# Altium footprint library Mylib.PcbLib: 294 footprints (part 16 of 19)
Each footprint in its own frame and in the unit in brackets; x right, y up, seen from the top. Pads: shape width x height; smd on the part's side, far side on the other; paste and mask are expansions set on the pad; w line width, h text height; cw(c..) or ccw(c..) is an arc to the next point about the centre after c.
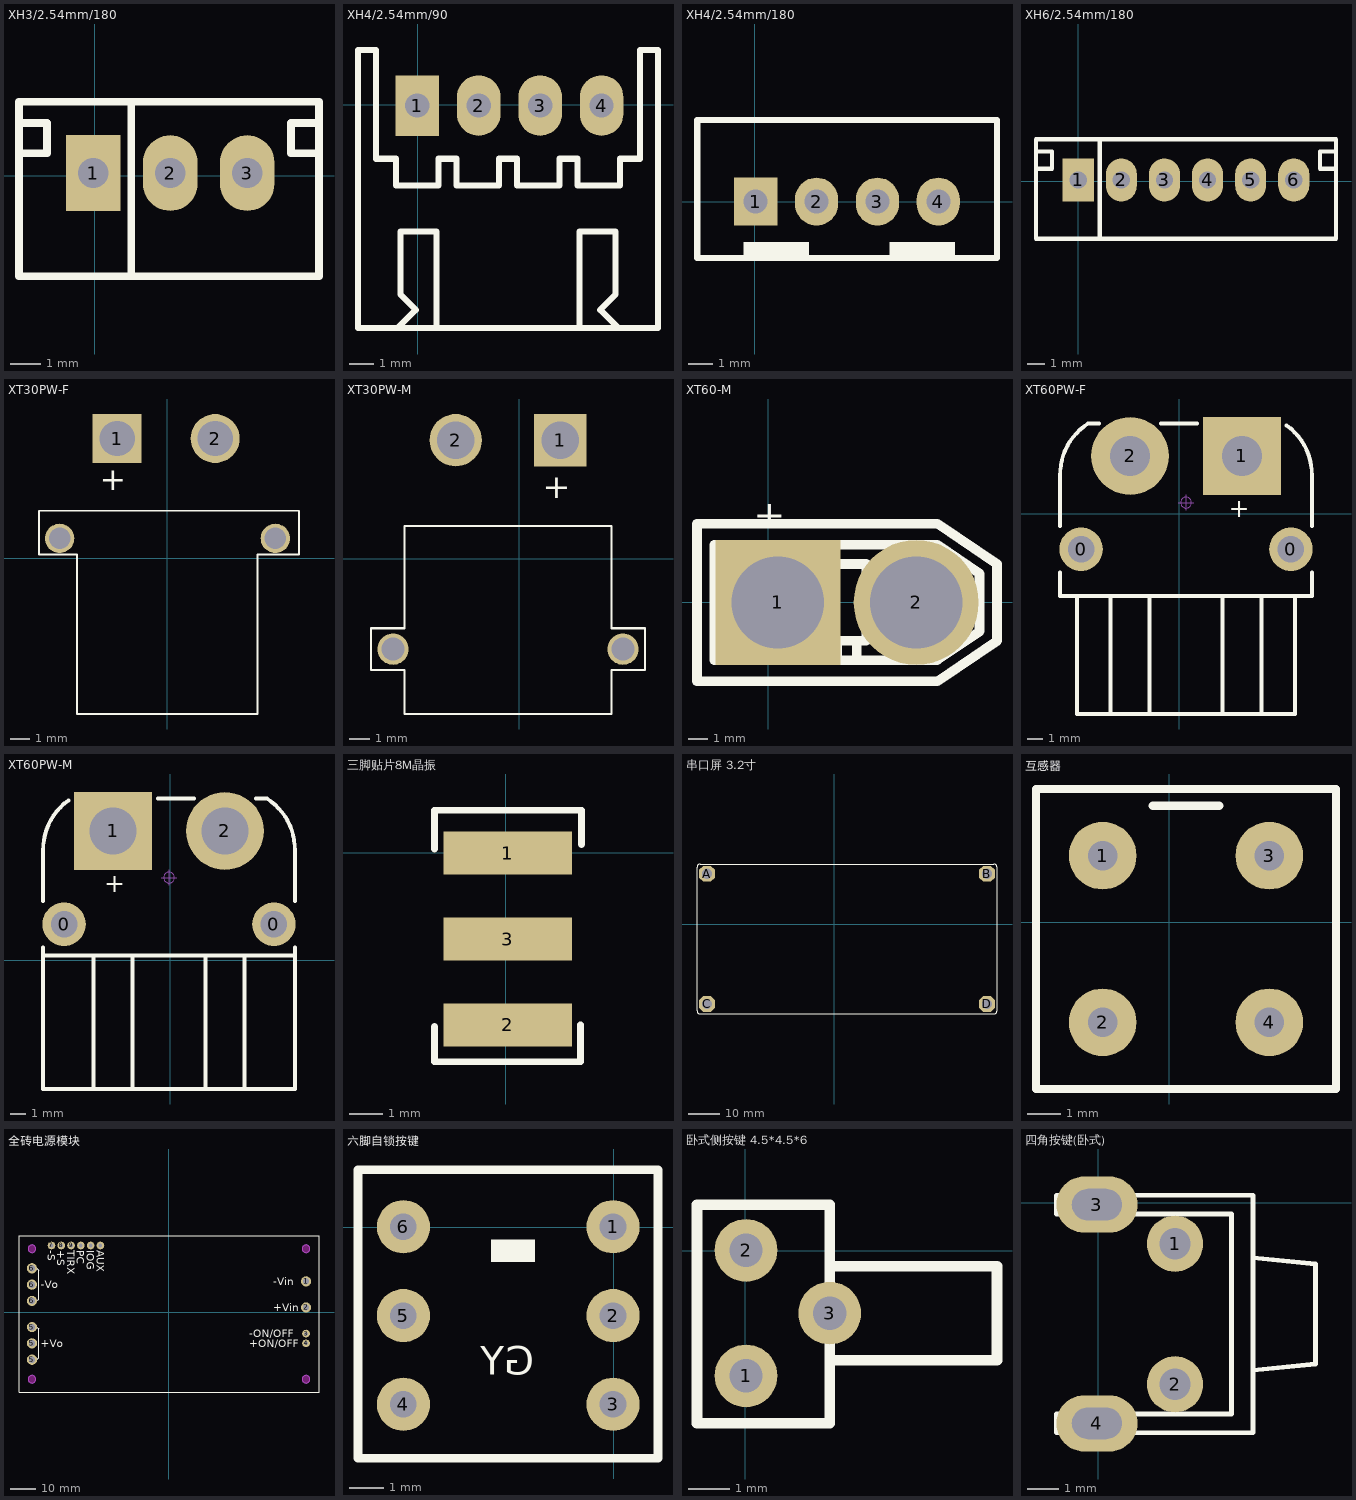
[diagram p15: the footprints below, top view; thin cyan lines are the x and y axes]

## XH3/2.54mm/180 [mm]
pads (3):
  rect 1.8x2.5 hole 1: 1(-0.045,0.08)
  oval 1.8x2.5 hole 1: 2(2.495,0.08) 3(5.035,0.08)
Top Overlay:
  lines w0.254: -2.495,0.73 -1.569,0.73 -1.569,1.73 -2.495,1.73 ; 1.205,-3.32 1.205,2.43 ; 7.405,0.73 6.479,0.73 6.479,1.73 7.405,1.73 ; -2.495,-3.32 -2.495,2.43 7.405,2.43 7.405,-3.32 -2.495,-3.32
3D body "JST-B3B-XH-A.STEP": height 7, standoff -3.4, extent -2.495,-3.32 7.405,2.43

## XH4/2.54mm/90 [mm]
pads (4):
  rect 1.8x2.5 hole 1: 1(-0.015,-0.035)
  oval 1.8x2.5 hole 1: 2(2.525,-0.035) 3(5.065,-0.035) 4(7.605,-0.035)
Top Overlay:
  lines w0.254: -0.805,-9.207 -0.079,-8.481 -0.715,-7.844 -0.715,-5.235 0.785,-5.235 0.785,-9.235 ; 6.685,-9.235 6.685,-5.235 8.185,-5.235 8.185,-7.844 7.548,-8.481 8.275,-9.207 ; -2.465,-9.235 9.935,-9.235 9.935,2.265 9.185,2.265 9.185,-2.235 8.36,-2.235 8.36,-3.335 6.61,-3.335 6.61,-2.235 5.86,-2.235 5.86,-3.335 4.11,-3.335 4.11,-2.235 3.36,-2.235 3.36,-3.335 1.61,-3.335 1.61,-2.235 0.86,-2.235 0.86,-3.335 -0.89,-3.335 -0.89,-2.235 -1.715,-2.235 -1.715,2.265 -2.465,2.265 -2.465,-9.235
3D body "JST-S4B-XH-A.STEP": height 6.1, standoff -3.4, extent -2.465,-9.235 9.935,2.265

## XH4/2.54mm/180 [mm]
pads (4):
  rect 1.8x2 hole 1: 1(0.045,0.005)
  oval 1.8x2 hole 1: 2(2.585,0.005) 3(5.125,0.005) 4(7.665,0.005)
Top Overlay:
  region: 2.273,-1.687 -0.463,-1.687 -0.463,-2.337 2.273,-2.337
  region: 8.369,-1.687 5.633,-1.687 5.633,-2.337 8.369,-2.337
  lines w0.24: 10.115,-2.345 10.115,0.005
  lines w0.254: -2.393,-2.32 -2.393,3.405 ; 10.115,0.005 10.115,3.405 ; -2.405,-2.345 10.115,-2.345 ; -2.405,-2.345 -2.405,3.405 ; -2.405,-2.345 -2.405,0.005 -2.405,3.405 ; -2.405,3.405 10.115,3.405 ; 10.115,-2.345 10.115,-2.345 ; 10.115,-2.345 10.115,3.405
3D body "User Library-B4B-XH-A.STEP": height 7, standoff -3.4, extent -2.345,-2.443 10.055,3.307

## XH6/2.54mm/180 [mm]
pads (6):
  rect 1.8x2.5 hole 1: 1(0.01,0.08)
  oval 1.8x2.5 hole 1: 2(2.51,0.08) 3(5.01,0.08) 4(7.51,0.08) 5(10.01,0.08) 6(12.51,0.08)
Top Overlay:
  lines w0.254: -2.44,0.73 -1.514,0.73 -1.514,1.73 -2.44,1.73 ; 1.26,-3.32 1.26,2.43 ; 14.96,0.73 14.034,0.73 14.034,1.73 14.96,1.73 ; -2.44,-3.32 -2.44,2.43 14.96,2.43 14.96,-3.32 -2.44,-3.32
3D body "JST-B6B-XH-A.STEP": height 7, standoff -3.4, extent -2.44,-3.32 14.96,2.43

## XT30PW-F [mm] "ĸͷ"
pads (4):
  rect 2.5x2.5 hole 1.8: 1(-2.566,6.095)
  round 2.5 hole 1.8: 2(2.434,6.095)
  round 1.5 hole 1.1: ""(-5.5,1) ""(5.5,1)
Top Overlay:
  lines w0.1: -6.55,0.178 -6.55,2.413 -4.95,2.413 4.95,2.413 6.706,2.413 6.706,0.178 4.597,0.178 4.597,-7.95 -4.623,-7.95 -4.623,0.178 -6.55,0.178
  text "+" at -2.108,4.826 h2
3D body "User Library-XT30PW-F.STEP": height 5, standoff -2, extent -6.55,-7.95 6.75,6.95

## XT30PW-M [mm] "公头"
pads (4):
  rect 2.5x2.5 hole 1.8: 1(1.959,5.673)
  round 2.5 hole 1.8: 2(-3.041,5.673)
  round 1.5 hole 1.1: ""(-6.041,-4.327) ""(4.959,-4.327)
Top Overlay:
  lines w0.1: -7.091,-5.327 -5.491,-5.327 -5.491,-7.427 4.409,-7.427 4.409,-5.327 6.009,-5.327 6.009,-3.327 4.409,-3.327 4.409,1.573 -5.491,1.573 -5.491,-3.327 -7.091,-3.327 -7.091,-5.327
  text "+" at 2.472,4.267 h2
3D body "User Library-XT30PW-M.STEP": height 5, standoff -2, extent -7.153,-7.381 6.147,6.569

## XT60-M [mm] "公头"
pads (2):
  rect 6.5x6.5 hole 4.8: 1(0.489,0)
  round 6.5 hole 4.8: 2(7.689,0)
Top Overlay:
  lines w0.5: 3.048,-3 -2.819,-3 ; 3.589,-3 3.589,-2 4.589,-2 4.589,-3 ; 5.089,-3 8.791,-3 -2.819,-3 ; 8.791,-3.001 10.982,-1.5 10.982,1.5 8.791,3.001 -2.819,3 -2.819,-3 ; -3.711,-4.1 -3.711,4.1 8.788,4.1 11.889,2 11.889,-2 8.788,-4.1 -3.711,-4.1 ; 3.089,-2 5.089,-2 5.089,2 3.089,2 3.089,-2
  text "+" at 0.9,5.6 h2.5
3D body "XT60H male.STEP": height 16.5, standoff -4.7, extent -3.81,-4.064 12.09,4.086

## XT60PW-F [mm] "ĸͷ"
pads (4):
  round 2.8 hole 1.7: 0(-6.305,-2.268) 0(7.195,-2.268)
  rect 5x5 hole 2.6: 1(4.045,3.732)
  round 5 hole 2.6: 2(-3.155,3.732)
Top Overlay:
  lines w0.254: -7.655,-3.768 -7.655,-5.268 8.545,-5.268 8.545,-3.768 ; -7.655,-0.768 -7.655,2.47 cw(c-3.755,2.532) -5.849,5.823 ; -6.555,-5.268 -6.555,-12.868 7.445,-12.868 7.445,-5.268 ; -5.849,5.832 -5.155,5.832 ; -4.405,-12.868 -4.405,-5.268 ; -1.905,-12.868 -1.905,-5.268 ; -1.155,5.832 1.145,5.832 ; 2.795,-12.868 2.795,-5.268 ; 5.295,-12.868 5.295,-5.268 ; 6.921,5.699 cw(c4.645,2.532) 8.545,2.47 ; 8.545,-0.768 8.545,2.524 ; 0.445,-5.268 ccw(c0.445,-5.268) 0.445,-5.268
  text "+" at 4.555,1.194 h2
Mechanical 15:
  circle w0.05: c0.445,0.732 r0.35
  lines w0.05: -0.055,0.732 0.945,0.732 ; 0.445,0.232 0.445,1.232
3D body "TX60PW-F20.STEP": height 8.65, standoff -2.35, extent -7.555,-12.868 8.445,5.752

## XT60PW-M [mm] "公头"
pads (4):
  round 2.8 hole 1.7: 0(-6.83,2.326) 0(6.67,2.326)
  rect 5x5 hole 3: 1(-3.68,8.326)
  round 5 hole 3: 2(3.52,8.326)
Top Overlay:
  lines w0.254: -8.18,0.826 -8.18,0.326 ; -8.18,3.826 -8.18,7.118 ; -8.18,7.065 cw(c-4.28,7.126) -6.556,10.294 ; -4.93,-8.274 -4.93,0.326 ; -2.43,-8.274 -2.43,0.326 ; -0.78,10.426 1.52,10.426 ; 2.27,-8.274 2.27,0.326 ; 4.77,-8.274 4.77,0.326 ; 5.52,10.426 6.214,10.426 ; 6.214,10.417 cw(c4.12,7.126) 8.02,7.065 8.02,3.826 ; 8.02,0.826 8.02,0.326 ; -8.18,0.326 -8.18,-8.274 8.02,-8.274 8.02,0.326 ; -8.18,0.326 8.02,0.326
  text "+" at -2.888,5.791 h2
Mechanical 15:
  circle w0.05: c-0.08,5.326 r0.35
  lines w0.05: -0.58,5.326 0.42,5.326 ; -0.08,4.826 -0.08,5.826
3D body "User Library-XT60IPW-M--3DModel-STEP-56544.step": height 4.2, standoff -6.75, extent -7.804,-8.1 7.696,9.5

## 三脚贴片8M晶振 [mm] "CSTCC8M00G53-RO"
pads (3):
  rect 3.8x1.27 smd: 1(0.06,-0.006) 2(0.06,-5.086) 3(0.06,-2.546)
Top Overlay:
  lines w0.203: -2.099,-5.137 -2.099,-6.178 2.219,-6.178 2.219,-5.086 ; -2.099,0.121 -2.099,1.264 2.244,1.264 2.244,0.248
3D body: height 1.5, standoff 0.1, extent -1.718,-6.229 1.838,1.264

## 串口屏 3.2寸 [mm]
pads (4):
  oct 5x5 hole 3.2: A(-40.3,15.9) B(48.3,15.9) C(-40.3,-25.3) D(48.3,-25.3)
Top Overlay:
  lines w0.127: -43.5,-27.5 ccw(c-42.5,-27.5) -42.5,-28.5 50.5,-28.5 ccw(c50.5,-27.5) 51.5,-27.5 51.5,18 ccw(c50.5,18) 50.5,19 -42.5,19 ccw(c-42.5,18) -43.5,18 -43.5,-27.5

## 互感器 [mil]
pads (4):
  round 80 hole 35: 1(-78.74,78.74) 2(-78.74,-118.11) 3(118.11,78.74) 4(118.11,-118.11)
Top Overlay:
  lines w10: -19.68,137.8 59.06,137.8 ; -157.48,-196.85 196.85,-196.85 196.85,157.48 -157.48,157.48 -157.48,-196.85

## 全砖电源模块 [mm]
pads (16):
  round 4 hole 2.5: 1(53.508,12.06) 2(53.508,1.9) 5(-53.182,-18.42) 5(-53.182,-12.07) 5(-53.182,-5.72) 6(-53.192,4.44) 6(-53.192,10.79) 6(-53.192,17.14)
  round 3 hole 1.4: 3(53.508,-8.26) 4(53.508,-12.07) 7(-45.592,26.03) 8(-41.782,26.03) 9(-37.972,26.03) 10(-34.162,26.03) 11(-30.352,26.03) 12(-26.542,26.03)
Top Overlay:
  lines w0.254: -51.277,-18.42 -50.525,-17.668 -50.525,-6.472 -51.277,-5.72 ; -51.266,4.44 -50.514,5.192 -50.514,16.388 -51.266,17.14 ; -58.242,-31.14 -58.242,29.86 58.558,29.86 58.558,-31.14 -58.242,-31.14
  text "+Vo" at -49.693,-13.57 h3
  text "-Vo" at -49.693,9.29 h3
  text "-S" at -47.092,24.105 h3
  text "+S" at -43.282,24.105 h3
  text "TIRX" at -39.472,24.105 h3
  text "PC" at -35.662,24.105 h3
  text "IOG" at -31.852,24.105 h3
  text "AUX" at -28.042,24.105 h3
  text "+ON/OFF" at 31.333,-13.57 h3
  text "-ON/OFF" at 31.333,-9.76 h3
  text "+Vin" at 40.83,0.4 h3
  text "-Vin" at 40.83,10.56 h3
Keep-Out Layer:
  board cut-out: 53.508,-27.54 53.656,-27.54 53.945,-27.483 54.218,-27.37 54.464,-27.206 54.673,-26.997 54.837,-26.751 54.95,-26.478 55.008,-26.188 55.008,-26.04 55.008,-25.893 54.95,-25.603 54.837,-25.33 54.673,-25.084 54.464,-24.875 54.218,-24.711 53.945,-24.598 53.656,-24.54 53.508,-24.54 53.36,-24.54 53.07,-24.598 52.797,-24.711 52.552,-24.875 52.343,-25.084 52.179,-25.33 52.065,-25.603 52.008,-25.893 52.008,-26.04 52.008,-26.188 52.065,-26.478 52.179,-26.751 52.343,-26.997 52.552,-27.206 52.797,-27.37 53.07,-27.483 53.36,-27.54
  board cut-out: 53.508,23.26 53.656,23.26 53.945,23.317 54.218,23.43 54.464,23.594 54.673,23.803 54.837,24.049 54.95,24.322 55.008,24.612 55.008,24.76 55.008,24.907 54.95,25.197 54.837,25.47 54.673,25.716 54.464,25.925 54.218,26.089 53.945,26.202 53.656,26.26 53.508,26.26 53.36,26.26 53.07,26.202 52.797,26.089 52.552,25.925 52.343,25.716 52.179,25.47 52.065,25.197 52.008,24.907 52.008,24.76 52.008,24.612 52.065,24.322 52.179,24.049 52.343,23.803 52.552,23.594 52.797,23.43 53.07,23.317 53.36,23.26
  board cut-out: -51.692,24.76 -51.692,24.612 -51.75,24.322 -51.863,24.049 -52.027,23.803 -52.236,23.594 -52.482,23.43 -52.755,23.317 -53.044,23.26 -53.192,23.26 -53.34,23.26 -53.63,23.317 -53.903,23.43 -54.148,23.594 -54.357,23.803 -54.521,24.049 -54.635,24.322 -54.692,24.612 -54.692,24.76 -54.692,24.907 -54.635,25.197 -54.521,25.47 -54.357,25.716 -54.148,25.925 -53.903,26.089 -53.63,26.202 -53.34,26.26 -53.192,26.26 -53.044,26.26 -52.755,26.202 -52.482,26.089 -52.236,25.925 -52.027,25.716 -51.863,25.47 -51.75,25.197 -51.692,24.907
  board cut-out: -51.692,-26.04 -51.692,-26.188 -51.75,-26.478 -51.863,-26.751 -52.027,-26.997 -52.236,-27.206 -52.482,-27.37 -52.755,-27.483 -53.044,-27.54 -53.192,-27.54 -53.34,-27.54 -53.63,-27.483 -53.903,-27.37 -54.148,-27.206 -54.357,-26.997 -54.521,-26.751 -54.635,-26.478 -54.692,-26.188 -54.692,-26.04 -54.692,-25.893 -54.635,-25.603 -54.521,-25.33 -54.357,-25.084 -54.148,-24.875 -53.903,-24.711 -53.63,-24.598 -53.34,-24.54 -53.192,-24.54 -53.044,-24.54 -52.755,-24.598 -52.482,-24.711 -52.236,-24.875 -52.027,-25.084 -51.863,-25.33 -51.75,-25.603 -51.692,-25.893
Mechanical 1:
  circle w0.254: c53.508,-26.04 r1.5
  circle w0.254: c53.508,24.76 r1.5
  circle w0.254: c-53.192,24.76 r1.5
  circle w0.254: c-53.192,-26.04 r1.5
3D body "全砖模块电源.step": height 12.7, standoff -5, extent -58.242,-31.14 58.558,29.86
3D body: height 0.25, standoff 0, extent 58.558,-31.14 58.558,-31.14
3D body: height 0.25, standoff 0, extent 12.33,-1.422 12.33,-1.422
3D body: height 0.25, standoff 0, extent 58.558,-31.14 58.558,-31.14
3D body: height 0.25, standoff 0, extent 58.558,-31.14 58.558,-31.14
3D body: height 0.25, standoff 0, extent 58.558,-31.14 58.558,-31.14

## 六脚自锁按键 [mil]
pads (6):
  round 60 hole 30: 1(-0.63,0.71) 2(-0.63,-99.29) 3(-0.63,-199.29) 4(-236.85,-199.29) 5(-236.85,-99.29) 6(-236.85,0.71)
Top Overlay:
  region: -88.43,-13.66 -138.43,-13.66 -138.43,-38.66 -88.43,-38.66
  lines w10: -288,-260 50,-260 50,65 -288,65 -288,-260
  text "GY" at -89.21,-176.46 h55
3D body "TL 2201.step": height 551.18, standoff -137.8, extent -287.32,-266 47.32,68.64

## 卧式侧按键 4.5*4.5*6 [mm] "卧式侧按键 4.5*4.5*6"
pads (3):
  round 1.5 hole 0.8: 1(0.022,-2.992) 2(0.022,0.008) 3(2.022,-1.492)
Top Overlay:
  lines w0.254: 2.022,-2.617 6.022,-2.617 6.022,-0.367 2.022,-0.367 ; -1.15,-4.125 2.022,-4.125 2.022,1.1 -1.15,1.1 -1.15,-4.125

## 四角按键(卧式) [mm] "轻触开关 卧式带支架"
pads (4):
  round 1.8 hole 1: 1(2.452,-1.308) 2(2.452,-5.808)
  oval 2.6x1.8 hole 1 slot 1.6 at 0 deg: 3(-0.048,-0.058) 4(-0.048,-7.058)
Top Overlay:
  lines w0.16: 1.452,-7.358 4.952,-7.358 ; 4.952,-5.358 6.952,-5.158 6.952,-1.958 4.952,-1.758 ; 4.952,-7.358 4.952,0.242 -1.348,0.242 -1.348,-0.358 4.252,-0.358 4.252,-6.758 -1.348,-6.758 -1.348,-7.358 4.952,-7.358